# Altium footprint library THU VIEN PCB.PCBLib: 911 footprints (part 4 of 57)
Each footprint in its own frame and in the unit in brackets; x right, y up, seen from the top. Pads: shape width x height; smd on the part's side, far side on the other; paste and mask are expansions set on the pad; w line width, h text height; cw(c..) or ccw(c..) is an arc to the next point about the centre after c.
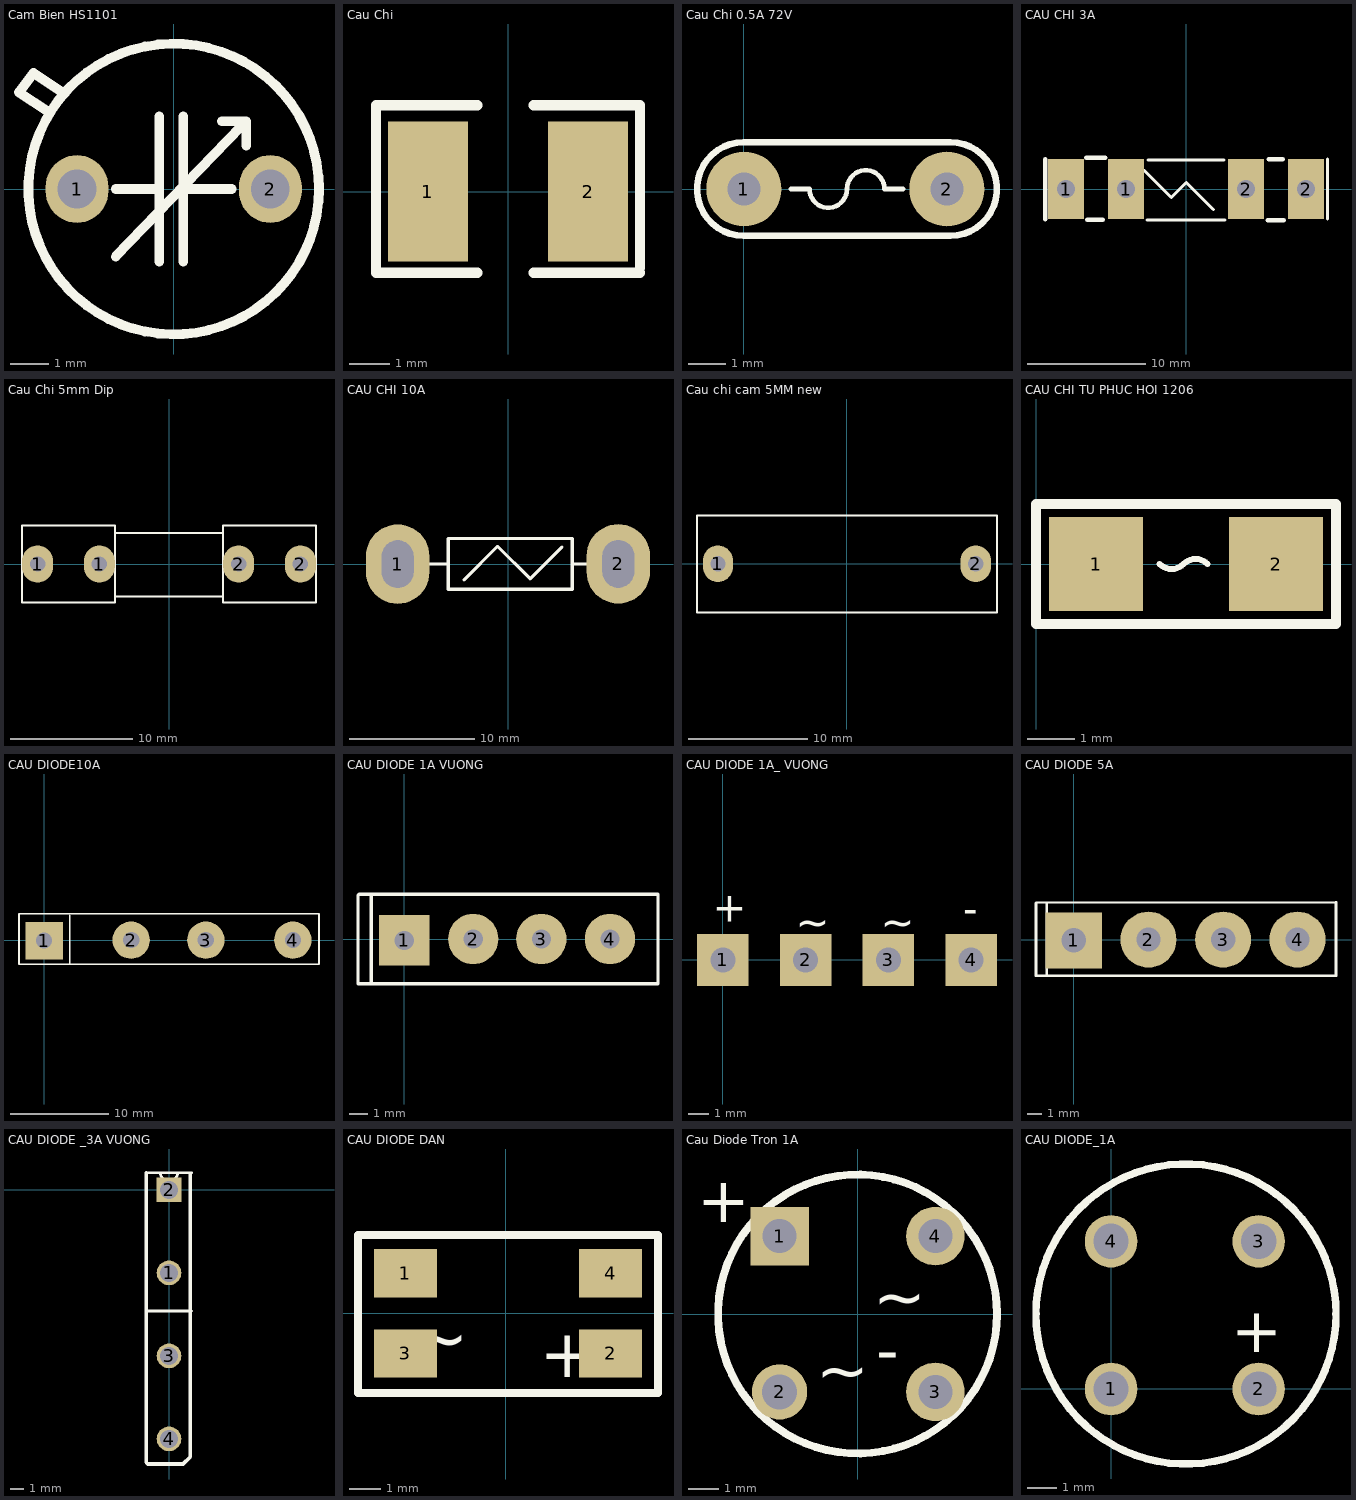
[diagram p3: the footprints below, top view; thin cyan lines are the x and y axes]

## Cam Bien HS1101 [mil]
pads (2):
  oval 65x70 hole 40: 1(-100,0) 2(100,0)
Top Overlay:
  circle w10: c0,0 r150.33
  lines w10: -130,80 -160,100 -145,120 -115,100 ; -60,-70 70,65 ; -60,0 -15,0 ; -15,-75 -15,75 ; 10,-75 10,75 ; 10,0 60,0 ; 50,70 75,70 75,65 75,45

## Cau Chi [mm] "Cau Tri"
pads (2):
  rect 2x3.5 smd: 1(-2,0) 2(2,0)
Top Overlay:
  lines w0.254: -0.762,-2.032 -3.302,-2.032 -3.302,2.159 -0.762,2.159 ; 0.635,-2.032 3.175,-2.032 ; 0.635,2.159 3.302,2.159 3.302,-1.905 ; 3.048,-2.032 3.302,-2.032
3D body "Fuse 1812L.step": height 1.34, standoff 0, extent -2.365,-1.705 2.365,1.705

## Cau Chi 0.5A 72V [mil] "Fuse"
pads (2):
  round 80 hole 35: 1(0,0) 2(216.54,0)
Top Overlay:
  lines w5: 50,0 70,0 ccw(c90,0) 110,0 cw(c130,0) 150,0 170,0
  lines w7: 0,-50 cw(c0,0) 0,50 220,50 cw(c220,0) 220,-50 0,-50
3D body "Cau Tri phuc hoiu 75V dip.STEP": height 446.06, standoff -132.28, extent -35.67,-60 255.67,58.11

## CAU CHI 3A [mil] "3A"
pads (4):
  rect 120x200 hole 60: 1(-400,0) 1(-200,0) 2(200,0) 2(400,0)
Top Overlay:
  lines w10: -469,-101 -469,99 ; -139,62 -49,-28 1,22 91,-68 ; -130,-103 130,-103 ; -127,97 127,97 ; 471,-100 471,100
  lines w15: -469,-101 -469,99 ; -333,104 -270,104 ; -330,-102 -277,-102 ; 273,-104 325,-104 ; 275,100 323,100
3D body: height 100, standoff 0, extent -335,-100 335,105

## Cau Chi 5mm Dip [mil] "De Fuse"
pads (4):
  oval 100x120 hole 50: 1(-425,0) 1(-225,0) 2(225,0) 2(425,0)
Top Overlay:
  lines w7: -175,-105 175,-105 ; -175,100 175,100 ; -475,-125 -475,125 -175,125 -175,-125 -475,-125 ; 175,-125 475,-125 475,125 175,125 175,-125
3D body "SW3dPS-Fuse Leg_2009.STEP": height 377.88, standoff -129.94, extent 219,-116.71 459,127
3D body "SW3dPS-Fuse Small 1A.STEP": height 370.39, standoff 169.61, extent -384.8,-98 390.8,102.79
3D body "SW3dPS-Fuse Leg_2009.STEP": height 377.88, standoff -129.94, extent -448,-117 -208,126.71

## CAU CHI 10A [mil] "Cau chi 10A"
pads (2):
  oval 200x250 hole 100 slot 150 at 90 deg: 1(-347,-0.5) 2(347,0.5)
Top Overlay:
  lines w10: -293,0.5 -193,0.5 ; -138,-49.5 -33,55.5 69.5,-47 169.5,53 ; 202,0.5 247,0.5 ; 202,80 202,-79.5 -188,-79.5 -188,80.5 202,80.5

## Cau chi cam 5MM new [mil]
pads (2):
  oval 100x120 hole 50: 1(-425,0) 2(425,0)
Top Overlay:
  lines w7: -494,124 -494,159 -474,159 -174,159 177,159 ; -494,125 -494,-125 -494,-161 -475,-161 -175,-161 ; -174,-161 177,-161 ; 175,-161 475,-161 ; 176,159 476,159 ; 473,159 494,159 ; 476,-161 495,-161 495,-127 495,123 ; 495,122 495,159
3D body "SW3dPS-Fuse Leg_2009.STEP": height 377.88, standoff -129.94, extent -448,-117 -208,126.71
3D body "SW3dPS-Fuse Small 1A.STEP": height 370.39, standoff 169.61, extent -384.8,-98 390.8,102.79
3D body "SW3dPS-Fuse Leg_2009.STEP": height 377.88, standoff -129.94, extent 219,-116.71 459,127

## CAU CHI TU PHUC HOI 1206 [mm]
pads (2):
  rect 2x2 smd: 1(1.27,0) 2(5.08,0)
Top Overlay:
  lines w0.127: 2.616,0 ccw(c2.87,0.254) 3.124,0 cw(c3.378,-0.254) 3.632,0
  lines w0.203: 0,-1.27 0,1.27 6.35,1.27 6.35,-1.27 0,-1.27

## CAU DIODE10A [mil] "CAU 10A det"
height 800
pads (4):
  rect 150x150 hole 65: 1(0,-2)
  round 150 hole 65: 2(350,0) 3(650,0) 4(1000,0)
Top Overlay:
  lines w7: 103,-95 103,99 ; -101,-97 1105,-97 1105,106.36 -101,104.86 -101,-97

## CAU DIODE 1A VUONG [mil] "CAU 1A DET"
height 800
pads (4):
  rect 110x110 hole 42: 1(0,-2)
  round 110 hole 42: 2(151,1) 3(300,1) 4(450,1)
Top Overlay:
  lines w7: -72,-95 -72,99 ; -101,-97 555,-97 555,99 -99,99 -101,97 -101,-97
3D body "SW3dPS-KBPM.STEP": height 453.36, standoff -499.4, extent -61.99,-90 511.99,107.24

## CAU DIODE 1A_ VUONG [mm]
pads (4):
  rect 2.5x2.5 / inner round 1.575 / far side rect 2.5x2.5 hole 1.2: 1(0,0) 2(4,0) 3(8,0) 4(12,0)
Top Overlay:
  text "~" at 3.531,1.118 h1.43
  text "~" at 7.62,1.13 h1.43
  text "+" at -0.483,1.841 h1.43
  text "-" at 11.608,1.778 h1.43
3D body "SW3dPS-KBPM.STEP": height 10.7, standoff -13.5, extent -1.27,-2.515 13.309,2.495

## CAU DIODE 5A [mil] "CAU 5A DET"
height 800
pads (4):
  rect 150x150 hole 65: 1(0,-2)
  round 150 hole 65: 2(200,0) 3(400,0) 4(599,0)
Top Overlay:
  lines w7: -72,-95 -72,99 ; -101,-97 702,-97 702,100 -99,99 -101,97 -101,-97
3D body "User Library-bridge 2.step": height 820.68, standoff -621.62, extent -138.98,-105 738.98,43.03

## CAU DIODE _3A VUONG [mil]
pads (4):
  round 70 hole 51.18 unplated: 1(0,-236.22) 3(0,-472.44) 4(0,-708.66)
  rect 70x70 hole 51.18 unplated: 2(0,0)
Top Overlay:
  lines w7.87: -64.37,-344.49 64.37,-344.49 ; -64.37,49.21 24.61,49.21 cw(c0,49.21) -24.61,49.21 64.37,49.21
  lines w10: -64.37,49.21 -64.37,-775.63 -60,-780 40,-780 60,-760 60,44.84

## CAU DIODE DAN [mm]
pads (4):
  rect 2x1.524 smd: 1(-3.175,1.27) 2(3.325,-1.27) 3(-3.175,-1.27) 4(3.325,1.27)
Top Overlay:
  lines w0.254: -4.675,-2.52 4.825,-2.52 4.825,2.48 -4.675,2.48 -4.675,-2.52
  text "+" at 1.075,-2.02 h1.52
  text "~" at -2.925,-1.52 h1.52

## Cau Diode Tron 1A [mm] "Bridge Rectifier; 4 Terminals; Body 9.4 x 9.4 mm (typ); Pitch 5.08 mm"
height 0.14
pads (4):
  rect 1.905x1.905 hole 1.1: 1(-2.54,2.54)
  round 1.8 hole 1.143: 2(-2.54,-2.54)
  round 1.905 hole 1.1: 3(2.54,-2.54) 4(2.54,2.54)
Top Overlay:
  circle w0.254: c0,0 r4.547
  text "~" at 0.508,-0.178 h1.5
  text "~" at -1.346,-2.565 h1.5
  text "-" at 0.61,-1.905 h1.5
  text "+" at -5.232,2.997 h1.5

## CAU DIODE_1A [mil]
pads (4):
  round 70 hole 47.24 unplated: 1(0,0) 2(196.85,0) 3(196.85,196.85) 4(0,196.85)
Top Overlay:
  circle w10: c100,100 r200
  text "+" at 220,40 h60